# Altium footprint library Metric_SMD.PcbLib: 185 footprints (part 2 of 12)
Each footprint in its own frame and in the unit in brackets; x right, y up, seen from the top. Pads: shape width x height; smd on the part's side, far side on the other; paste and mask are expansions set on the pad; w line width, h text height; cw(c..) or ccw(c..) is an arc to the next point about the centre after c.
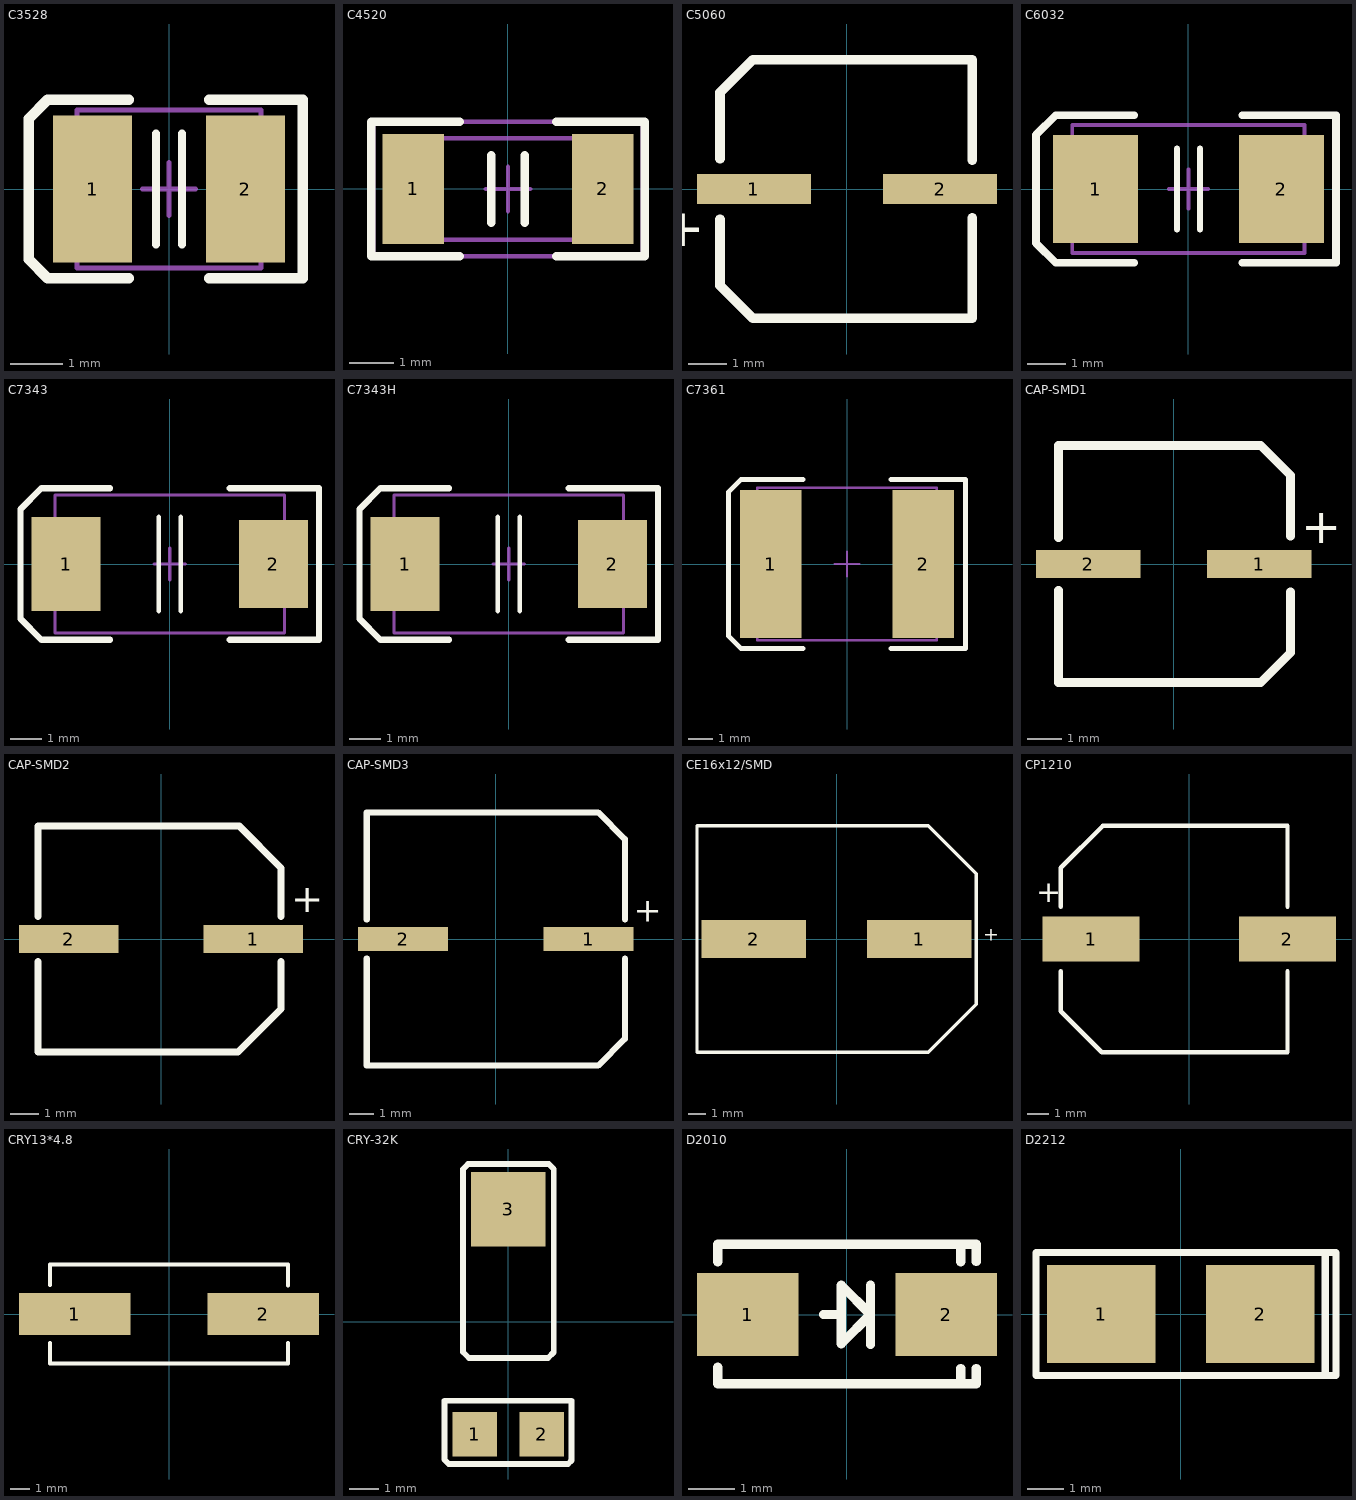
[diagram p1: the footprints below, top view; thin cyan lines are the x and y axes]

## C3528 [mm] "B封装,极性电容, Body 3.5x2.8mm"
height 2.1
pads (2):
  rect 1.5x2.8 smd: 1(-1.45,0) 2(1.45,0)
Top Overlay:
  lines w0.152: -0.25,-1.05 -0.25,1.05 ; 0.25,-1.05 0.25,1.05
  lines w0.2: -0.762,-1.7 -2.3,-1.7 -2.667,-1.333 -2.667,1.333 -2.3,1.7 -0.762,1.7 ; 0.762,-1.7 2.54,-1.7 2.54,1.7 0.762,1.7 ; 1.905,-1.7 2.237,-1.7
Mechanical 13:
  lines w0.1: -1.75,-1.5 -1.75,1.5 1.75,1.5 1.75,-1.5 -1.75,-1.5
Mechanical 15:
  lines w0.1: -0.5,0 0.5,0 ; 0,-0.5 0,0.5
3D body "User Library-AVX_BCASE.STEP": height 2.03, standoff 0, extent -1.748,-1.533 1.952,1.397

## C4520 [mm] "极性电容, Body 4.5x2.0mm"
height 1.8
pads (2):
  rect 1.4x2.5 smd: 1(-2.15,0) 2(2.15,0)
Top Overlay:
  lines w0.2: -1.1,-1.524 -3.099,-1.524 -3.099,1.524 -1.1,1.524 ; -0.381,-0.762 -0.381,0.762 ; 0.381,-0.762 0.381,0.762 ; 1.1,-1.524 3.099,-1.524 3.099,1.524 1.1,1.524
Mechanical 13:
  lines w0.1: -2.4,-1.15 2.4,-1.15 2.4,1.15 -2.4,1.15 -2.4,-1.15
Mechanical 15:
  lines w0.1: -0.5,0 0.5,0 ; 0,-0.5 0,0.5 ; -3.05,-1.524 3.05,-1.524 3.05,1.524 -3.05,1.524 -3.05,-1.524
3D body: height 2.03, standoff 0, extent -2.4,-1.15 2.4,1.15

## C5060 [mm] "圆柱型表贴电解电容5x6mm高6mm"
height 6
pads (2):
  rect 3x0.8 smd: 1(-2.45,0) 2(2.45,0)
Top Overlay:
  lines w0.254: -3.346,-0.8 -3.346,-2.54 -2.486,-3.4 3.3,-3.4 3.3,-0.76 ; -3.346,0.8 -3.346,2.54 -2.486,3.4 3.3,3.4 3.3,0.76
  text "+" at -3.75,-0.65 h1
3D body: height 1, standoff 0, extent -3.436,-3.486 3.536,3.5
3D body: height 4, standoff 0, extent -2.54,-2.69 2.44,2.3

## C6032 [mm] "C封装,极性电容, Body6.0x3.2mm"
height 2.8
pads (2):
  rect 2.2x2.8 smd: 1(-2.4,0) 2(2.4,0)
Top Overlay:
  lines w0.152: -0.3,-1.05 -0.3,1.05 ; 0.3,-1.05 0.3,1.05
  lines w0.2: -1.397,-1.905 -3.429,-1.905 -3.937,-1.397 -3.937,1.397 -3.429,1.905 -1.397,1.905 ; 1.397,-1.905 3.81,-1.905 3.81,1.905 1.397,1.905
Mechanical 13:
  lines w0.1: -3,-1.65 -3,1.65 3,1.65 3,-1.65 -3,-1.65
Mechanical 15:
  lines w0.1: -0.5,0 0.5,0 ; 0,-0.5 0,0.5
3D body: height 1.8, standoff 0, extent -3,-1.65 3,1.65

## C7343 [mm] "D封装,极性电容, Body7.3x4.3mm"
height 3.1
pads (2):
  rect 2.2x3 smd: 1(-3.3,0)
  rect 2.2x2.8 smd: 2(3.3,0)
Top Overlay:
  lines w0.152: -0.35,-1.5 -0.35,1.5 ; 0.35,-1.5 0.35,1.5
  lines w0.2: -1.9,-2.413 -4.087,-2.413 -4.75,-1.75 -4.75,1.75 -4.087,2.413 -1.9,2.413 ; 1.905,-2.413 4.75,-2.413 4.75,2.413 1.905,2.413
Mechanical 13:
  lines w0.1: -3.65,-2.2 -3.65,2.2 3.65,2.2 3.65,-2.2 -3.65,-2.2
Mechanical 15:
  lines w0.1: -0.5,0 0.5,0 ; 0,-0.5 0,0.5
3D body "User Library-CAP_TANT_7343-31.STEP": height 3.1, standoff 0, extent -3.749,-2.365 3.851,2.235

## C7343H [mm] "E封装,极性电容, Body7.3x4.3mm"
height 4.3
pads (2):
  rect 2.2x3 smd: 1(-3.3,0)
  rect 2.2x2.8 smd: 2(3.3,0)
Top Overlay:
  lines w0.152: -0.35,-1.5 -0.35,1.5 ; 0.35,-1.5 0.35,1.5
  lines w0.2: -1.905,-2.413 -4.087,-2.413 -4.75,-1.75 -4.75,1.75 -4.087,2.413 -1.905,2.413 ; 1.905,-2.413 4.75,-2.413 4.75,2.413 1.905,2.413
Mechanical 13:
  lines w0.1: -3.65,-2.2 3.65,-2.2 3.65,2.2 -3.65,2.2 -3.65,-2.2
Mechanical 15:
  lines w0.1: -0.5,0 0.5,0 ; 0,-0.5 0,0.5
3D body: height 1.8, standoff 0, extent -3.65,-2.2 3.65,2.2

## C7361 [mm] "V封装,极性电容, Body7.3x6.1mm"
height 3.75
pads (2):
  rect 2.5x6 smd: 1(-3.1,0) 2(3.1,0)
Top Overlay:
  lines w0.2: -1.778,-3.429 -4.318,-3.429 -4.826,-2.921 -4.826,2.921 -4.318,3.429 -1.778,3.429 ; 1.778,-3.429 4.826,-3.429 4.826,3.429 1.778,3.429
Mechanical 13:
  lines w0.1: -3.65,-3.1 3.65,-3.1 3.65,3.1 -3.65,3.1 -3.65,-3.1
Mechanical 15:
  lines w0.1: -0.5,0 0.5,0 ; 0,-0.5 0,0.5
3D body: height 1.8, standoff 0, extent -3.65,-3.1 3.65,3.1

## CAP-SMD1 [mm] "100u10V表贴电解"
height 7
pads (2):
  rect 3x0.8 smd: 1(2.45,0) 2(-2.45,0)
Top Overlay:
  lines w0.254: -3.3,-0.76 -3.3,-3.4 2.486,-3.4 3.346,-2.54 3.346,-0.8 ; -3.3,0.76 -3.3,3.4 2.486,3.4 3.346,2.54 3.346,0.8
  text "+" at 3.65,0.6 h1

## CAP-SMD2 [mil] "220u25V表贴电解"
height 354.33
pads (2):
  rect 140x40 smd: 1(130,0) 2(-130,0)
Top Overlay:
  lines w10: -173.31,-31.5 -173.31,-159.06 108.58,-159.06 169.21,-98.43 169.21,-31.5 ; -173.31,31.5 -173.31,159.06 110.16,159.06 169.21,100 169.21,31.5
  text "+" at 183.15,37.4 h39.37

## CAP-SMD3 [mm] "470u25V表贴电解"
pads (2):
  rect 3.7x1 smd: 1(3.81,0) 2(-3.81,0)
Top Overlay:
  lines w0.254: -5.3,-0.8 -5.3,-5.2 4.2,-5.2 5.3,-4.1 5.3,-0.8 ; -5.3,0.8 -5.3,5.2 4.2,5.2 5.3,4.1 5.3,0.8
  text "+" at 5.66,0.7 h1

## CE16x12/SMD [mm] "16x12mm SMD电解电容"
height 10
pads (2):
  rect 6x2.2 smd: 1(4.75,0) 2(-4.75,0)
Top Overlay:
  lines w0.2: 2.675,6.5 5.25,6.5 ; 5.25,6.5 2.5,6.5 -8,6.5 -8,-6.5 2.5,-6.5 5.25,-6.5 8,-3.75 8,3.75 5.25,6.5
  text "+" at 8.4,-0.1 h0.8

## CP1210 [mm] "G,Conductive Polymer Hybrid Aluminum Electrolytic Capacitors,12X10.3X10.5mm"
height 10.5
pads (2):
  rect 4.5x2.1 smd: 1(-4.55,0) 2(4.55,0)
Top Overlay:
  lines w0.2: -5.95,-1.5 -5.95,-3.35 -4.05,-5.25 ; -5.95,1.5 -5.95,3.3 -4,5.25 4.55,5.25 4.55,1.5 ; -4,-5.25 4.55,-5.25 4.55,-1.5
  text "+" at -7.1,1.7 h1.02

## CRY13*4.8 [mm] "贴片晶振,13*4.8*4.3mm"
height 4.3
pads (2):
  rect 5.6x2.1 smd: 1(-4.75,0) 2(4.75,0)
Top Overlay:
  lines w0.2: -6,-1.46 -6,-2.5 6,-2.5 6,-1.46 ; -6,1.46 -6,2.5 6,2.5 6,1.44
3D body "User Library-Crystal HC49_US-SM.STEP": height 4.3, standoff 0, extent -6.38,-2.45 6.42,2.38

## CRY-32K [mil] "圆柱型 32KHz晶体,卧式安装"
height 78.74
pads (3):
  rect 60x60 smd: 1(-45,-151) 2(45,-151)
  rect 100x100 smd: 3(0,151)
Top Overlay:
  lines w7.87: 54.6,211.7 61,205.3 ; 61,205.3 61,-41 53.36,-48.64 -52.87,-48.64 -61,-40.51 -61,205 -54,212 54.3,212 61,205.3 ; -86,-185 -80,-191 80,-191 85,-186 85,-106 -86,-106 -86,-185
3D body: height 78.66, standoff 0.08, extent -39.43,-116.48 39,198.48

## D2010 [mm] "SMA,DO-214AC"
height 2.62
pads (2):
  rect 2.2x1.8 smd: 1(-2.15,0) 2(2.15,0)
Top Overlay:
  lines w0.2: -2.8,-1.143 -2.8,-1.5 2.8,-1.5 2.8,-1.168 ; -2.8,1.143 -2.8,1.524 2.8,1.524 ; -0.508,0 -0.127,0 ; 0.508,-0.65 0.508,0.635 ; 2.464,-1.5 2.464,-1.168 ; 2.464,1.143 2.464,1.524 ; -0.127,-0.635 -0.127,0.635 0.508,0 -0.127,-0.635
  lines w0.203: 2.8,1.149 2.8,1.524
3D body "User Library-SMA-1.STEP": height 2.25, standoff -0.05, extent -2.6,-1.448 2.6,1.452

## D2212 [mm] "2212 二极管, 典型1N5822/SMD"
height 3.2
pads (2):
  rect 3x2.7 smd: 1(-2.2,0) 2(2.2,0)
Top Overlay:
  lines w0.2: 4,-1.7 4.3,-1.7 4.3,1.7 4,1.7 ; 4,-1.7 4,1.7 ; 4,-1.7 -4,-1.7 -4,1.7 4,1.7
3D body: height 2, standoff 0.01, extent -2.5,-1.4 2.9,1.4